# Altium footprint library TSOP65P.PcbLib: 13 footprints
Each footprint in its own frame and in the unit in brackets; x right, y up, seen from the top. Pads: shape width x height; smd on the part's side, far side on the other; paste and mask are expansions set on the pad; w line width, h text height; cw(c..) or ccw(c..) is an arc to the next point about the centre after c.
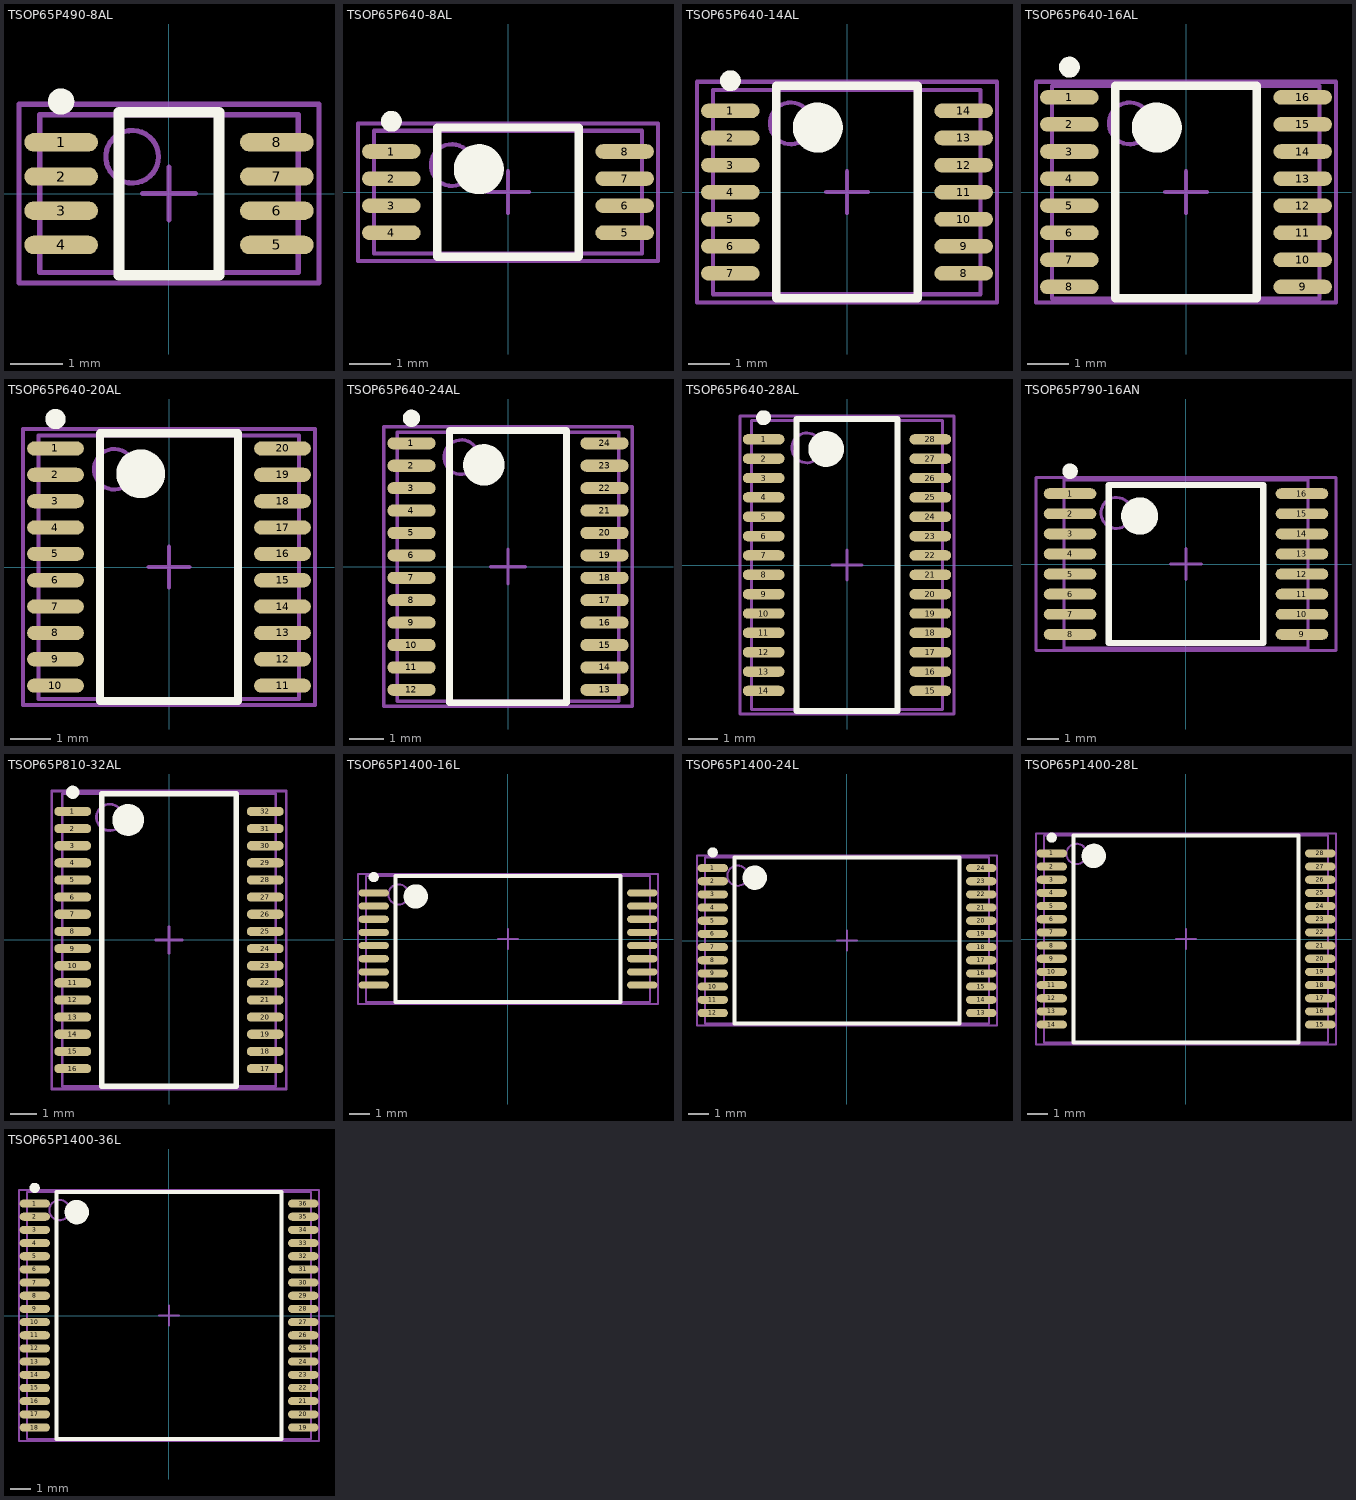
[diagram p0: the footprints below, top view; thin cyan lines are the x and y axes]

## TSOP65P490-8AL [mm] "TSOP, 8-Leads, Body 3x3mm, Pitch 0.65mm, IPC High Density"
height 1.1
pads (8):
  oval 1.4x0.35 smd: 1(-2.05,0.975) 2(-2.05,0.325) 3(-2.05,-0.325) 4(-2.05,-0.975) 5(2.05,-0.975) 6(2.05,-0.325) 7(2.05,0.325) 8(2.05,0.975)
Top Overlay:
  circle w0.25: c-2.05,1.75 r0.125
  lines w0.2: -0.95,-1.55 -0.95,1.55 0.95,1.55 0.95,-1.55 -0.95,-1.55
Mechanical 13:
  circle w0.1: c-0.7,0.7 r0.5
  lines w0.1: -2.458,-1.5 -2.458,1.5 2.458,1.5 2.458,-1.5 -2.458,-1.5
Mechanical 15:
  lines w0.1: -0.5,0 0.5,0 ; 0,-0.5 0,0.5 ; -2.85,-1.7 -2.85,1.7 2.85,1.7 2.85,-1.7 -2.85,-1.7
3D body: height 0.98, standoff 0.02, extent -2.458,-1.5 2.459,1.5

## TSOP65P640-8AL [mm] "TSOP, 8-Leads, Body 3x4.4mm, Pitch 0.65mm, IPC High Density"
height 1.1
pads (8):
  oval 1.4x0.35 smd: 1(-2.8,0.975) 2(-2.8,0.325) 3(-2.8,-0.325) 4(-2.8,-0.975) 5(2.8,-0.975) 6(2.8,-0.325) 7(2.8,0.325) 8(2.8,0.975)
Top Overlay:
  circle w0.25: c-2.8,1.7 r0.125
  circle w0.6: c-0.7,0.55 r0.3
  lines w0.2: -1.7,-1.55 -1.7,1.55 1.7,1.55 1.7,-1.55 -1.7,-1.55
Mechanical 13:
  circle w0.1: c-1.35,0.65 r0.5
  lines w0.1: -3.215,-1.475 -3.215,1.475 3.215,1.475 3.215,-1.475 -3.215,-1.475
Mechanical 15:
  lines w0.1: -0.5,0 0.5,0 ; 0,-0.5 0,0.5 ; -3.6,-1.65 -3.6,1.65 3.6,1.65 3.6,-1.65 -3.6,-1.65
3D body: height 1, standoff 0, extent -3.215,-1.475 3.206,1.475

## TSOP65P640-14AL [mm] "TSOP, 14-Leads, Body 5x4.4mm, Pitch 0.65mm, IPC High Density"
height 1.2
pads (14):
  oval 1.4x0.35 smd: 1(-2.8,1.95) 2(-2.8,1.3) 3(-2.8,0.65) 4(-2.8,0) 5(-2.8,-0.65) 6(-2.8,-1.3) 7(-2.8,-1.95) 8(2.8,-1.95) 9(2.8,-1.3) 10(2.8,-0.65) 11(2.8,0) 12(2.8,0.65) 13(2.8,1.3) 14(2.8,1.95)
Top Overlay:
  circle w0.25: c-2.8,2.675 r0.125
  circle w0.6: c-0.7,1.55 r0.3
  lines w0.2: -1.7,-2.55 -1.7,2.55 1.7,2.55 1.7,-2.55 -1.7,-2.55
Mechanical 13:
  circle w0.1: c-1.35,1.65 r0.5
  lines w0.1: -3.215,-2.45 -3.215,2.45 3.206,2.45 3.206,-2.45 -3.215,-2.45
Mechanical 15:
  lines w0.1: -0.5,0 0.5,0 ; 0,-0.5 0,0.5 ; -3.6,-2.65 -3.6,2.65 3.6,2.65 3.6,-2.65 -3.6,-2.65
3D body: height 1, standoff 0, extent -3.215,-2.45 3.206,2.45

## TSOP65P640-16AL [mm] "TSOP, 16-Leads, Body 5x4.4mm, Pitch 0.65mm, IPC High Density"
height 1.1
pads (16):
  oval 1.4x0.35 smd: 1(-2.8,2.275) 2(-2.8,1.625) 3(-2.8,0.975) 4(-2.8,0.325) 5(-2.8,-0.325) 6(-2.8,-0.975) 7(-2.8,-1.625) 8(-2.8,-2.275) 9(2.8,-2.275) 10(2.8,-1.625) 11(2.8,-0.975) 12(2.8,-0.325) 13(2.8,0.325) 14(2.8,0.975) 15(2.8,1.625) 16(2.8,2.275)
Top Overlay:
  circle w0.6: c-0.7,1.55 r0.3
  circle w0.25: c-2.8,3 r0.125
  lines w0.2: -1.7,-2.55 1.7,-2.55 1.7,2.55 -1.7,2.55 -1.7,-2.55
Mechanical 13:
  circle w0.1: c-1.35,1.65 r0.5
  lines w0.1: -3.215,-2.55 3.206,-2.55 3.206,2.55 -3.215,2.55 -3.215,-2.55
Mechanical 15:
  lines w0.1: -0.5,0 0.5,0 ; 0,-0.5 0,0.5 ; -3.6,-2.65 3.6,-2.65 3.6,2.65 -3.6,2.65 -3.6,-2.65
3D body: height 1, standoff 0, extent -3.215,-2.55 3.206,2.55

## TSOP65P640-20AL [mm] "TSOP, 20-Leads, Body 6.5x4.4mm, Pitch 0.65mm, IPC High Density"
height 1.1
pads (20):
  oval 1.4x0.35 smd: 1(-2.8,2.925) 2(-2.8,2.275) 3(-2.8,1.625) 4(-2.8,0.975) 5(-2.8,0.325) 6(-2.8,-0.325) 7(-2.8,-0.975) 8(-2.8,-1.625) 9(-2.8,-2.275) 10(-2.8,-2.925) 11(2.8,-2.925) 12(2.8,-2.275) 13(2.8,-1.625) 14(2.8,-0.975) 15(2.8,-0.325) 16(2.8,0.325) 17(2.8,0.975) 18(2.8,1.625) 19(2.8,2.275) 20(2.8,2.925)
Top Overlay:
  circle w0.25: c-2.8,3.65 r0.125
  circle w0.6: c-0.7,2.3 r0.3
  lines w0.2: -1.7,-3.3 -1.7,3.3 1.7,3.3 1.7,-3.3 -1.7,-3.3
Mechanical 13:
  circle w0.1: c-1.35,2.412 r0.5
  lines w0.1: -3.215,-3.25 3.206,-3.25 3.206,3.25 -3.215,3.25 -3.215,-3.25
Mechanical 15:
  lines w0.1: -0.5,0 0.5,0 ; 0,-0.5 0,0.5 ; -3.6,-3.4 -3.6,3.4 3.6,3.4 3.6,-3.4 -3.6,-3.4
3D body: height 1, standoff 0, extent -3.215,-3.25 3.206,3.25

## TSOP65P640-24AL [mm] "TSOP, 24-Leads, Body 7.8x4.4mm, Pitch 0.65mm, IPC High Density"
height 1.1
pads (24):
  oval 1.4x0.35 smd: 1(-2.8,3.575) 2(-2.8,2.925) 3(-2.8,2.275) 4(-2.8,1.625) 5(-2.8,0.975) 6(-2.8,0.325) 7(-2.8,-0.325) 8(-2.8,-0.975) 9(-2.8,-1.625) 10(-2.8,-2.275) 11(-2.8,-2.925) 12(-2.8,-3.575) 13(2.8,-3.575) 14(2.8,-2.925) 15(2.8,-2.275) 16(2.8,-1.625) 17(2.8,-0.975) 18(2.8,-0.325) 19(2.8,0.325) 20(2.8,0.975) 21(2.8,1.625) 22(2.8,2.275) 23(2.8,2.925) 24(2.8,3.575)
Top Overlay:
  circle w0.6: c-0.7,2.95 r0.3
  circle w0.25: c-2.8,4.3 r0.125
  lines w0.2: -1.7,-3.95 1.7,-3.95 1.7,3.95 -1.7,3.95 -1.7,-3.95
Mechanical 13:
  circle w0.1: c-1.35,3.174 r0.5
  lines w0.1: -3.215,-3.9 -3.215,3.9 3.206,3.9 3.206,-3.9 -3.215,-3.9
Mechanical 15:
  lines w0.1: -0.5,0 0.5,0 ; 0,-0.5 0,0.5 ; -3.6,-4.05 3.6,-4.05 3.6,4.05 -3.6,4.05 -3.6,-4.05
3D body: height 1, standoff 0, extent -3.215,-3.9 3.206,3.9

## TSOP65P640-28AL [mm] "TSOP, 28-Leads, Body 9.7x4.4mm, Pitch 0.65mm, IPC High Density"
height 1.1
pads (28):
  oval 1.4x0.35 smd: 1(-2.8,4.225) 2(-2.8,3.575) 3(-2.8,2.925) 4(-2.8,2.275) 5(-2.8,1.625) 6(-2.8,0.975) 7(-2.8,0.325) 8(-2.8,-0.325) 9(-2.8,-0.975) 10(-2.8,-1.625) 11(-2.8,-2.275) 12(-2.8,-2.925) 13(-2.8,-3.575) 14(-2.8,-4.225) 15(2.8,-4.225) 16(2.8,-3.575) 17(2.8,-2.925) 18(2.8,-2.275) 19(2.8,-1.625) 20(2.8,-0.975) 21(2.8,-0.325) 22(2.8,0.325) 23(2.8,0.975) 24(2.8,1.625) 25(2.8,2.275) 26(2.8,2.925) 27(2.8,3.575) 28(2.8,4.225)
Top Overlay:
  circle w0.6: c-0.7,3.9 r0.3
  circle w0.25: c-2.8,4.95 r0.125
  lines w0.2: -1.7,-4.9 1.7,-4.9 1.7,4.9 -1.7,4.9 -1.7,-4.9
Mechanical 13:
  circle w0.1: c-1.35,3.936 r0.5
  lines w0.1: -3.215,-4.85 -3.215,4.85 3.206,4.85 3.206,-4.85 -3.215,-4.85
Mechanical 15:
  lines w0.1: -0.5,0 0.5,0 ; 0,-0.5 0,0.5 ; -3.6,-5 3.6,-5 3.6,5 -3.6,5 -3.6,-5
3D body: height 1, standoff 0, extent -3.215,-4.85 3.206,4.85

## TSOP65P790-16AN [mm] "TSOP, 16-Leads, Body 6.33x5.38mm, Pitch 0.65mm, IPC Medium Density"
height 1.1
pads (16):
  oval 1.7x0.35 smd: 1(-3.75,2.275) 2(-3.75,1.625) 3(-3.75,0.975) 4(-3.75,0.325) 5(-3.75,-0.325) 6(-3.75,-0.975) 7(-3.75,-1.625) 8(-3.75,-2.275) 9(3.75,-2.275) 10(3.75,-1.625) 11(3.75,-0.975) 12(3.75,-0.325) 13(3.75,0.325) 14(3.75,0.975) 15(3.75,1.625) 16(3.75,2.275)
Top Overlay:
  circle w0.6: c-1.5,1.55 r0.3
  circle w0.25: c-3.75,3 r0.125
  lines w0.2: -2.5,-2.55 2.5,-2.55 2.5,2.55 -2.5,2.55 -2.5,-2.55
Mechanical 13:
  circle w0.1: c-2.25,1.65 r0.5
  lines w0.1: -3.95,-2.725 3.95,-2.725 3.95,2.725 -3.95,2.725 -3.95,-2.725
Mechanical 15:
  lines w0.1: -0.5,0 0.5,0 ; 0,-0.5 0,0.5 ; -4.85,-2.8 4.85,-2.8 4.85,2.8 -4.85,2.8 -4.85,-2.8
3D body: height 1.15, standoff 0.05, extent -3.95,-2.725 3.95,2.725
3D body: height 0, standoff 0, extent -3.15,-2.55 -3.15,-2.55
3D body: height 0, standoff 0, extent -1.956,-0.864 -1.956,-0.864

## TSOP65P810-32AL [mm] "TSOP, 32-Leads, Body 11x6.2mm, Pitch 0.65mm, IPC High Density"
height 1.2
pads (32):
  oval 1.4x0.35 smd: 1(-3.65,4.875) 2(-3.65,4.225) 3(-3.65,3.575) 4(-3.65,2.925) 5(-3.65,2.275) 6(-3.65,1.625) 7(-3.65,0.975) 8(-3.65,0.325) 9(-3.65,-0.325) 10(-3.65,-0.975) 11(-3.65,-1.625) 12(-3.65,-2.275) 13(-3.65,-2.925) 14(-3.65,-3.575) 15(-3.65,-4.225) 16(-3.65,-4.875) 17(3.65,-4.875) 18(3.65,-4.225) 19(3.65,-3.575) 20(3.65,-2.925) 21(3.65,-2.275) 22(3.65,-1.625) 23(3.65,-0.975) 24(3.65,-0.325) 25(3.65,0.325) 26(3.65,0.975) 27(3.65,1.625) 28(3.65,2.275) 29(3.65,2.925) 30(3.65,3.575) 31(3.65,4.225) 32(3.65,4.875)
Top Overlay:
  circle w0.6: c-1.55,4.55 r0.3
  circle w0.25: c-3.65,5.6 r0.125
  lines w0.2: -2.55,-5.55 2.55,-5.55 2.55,5.55 -2.55,5.55 -2.55,-5.55
Mechanical 13:
  circle w0.1: c-2.25,4.65 r0.5
  lines w0.1: -4.05,-5.55 4.05,-5.55 4.05,5.55 -4.05,5.55 -4.05,-5.55
Mechanical 15:
  lines w0.1: -0.5,0 0.5,0 ; 0,-0.5 0,0.5 ; -4.45,-5.65 4.45,-5.65 4.45,5.65 -4.45,5.65 -4.45,-5.65
3D body: height 1.2, standoff 0, extent -4.05,-5.55 4.05,5.488

## TSOP65P1400-16L [mm] "TSOP, 16-Leads, Body 6.2x12.6mm, Pitch 0.65mm, IPC High Density"
height 1.27
pads (16):
  oval 1.5x0.35 smd: 1(-6.625,2.275) 2(-6.625,1.625) 3(-6.625,0.975) 4(-6.625,0.325) 5(-6.625,-0.325) 6(-6.625,-0.975) 7(-6.625,-1.625) 8(-6.625,-2.275) 9(6.625,-2.275) 10(6.625,-1.625) 11(6.625,-0.975) 12(6.625,-0.325) 13(6.625,0.325) 14(6.625,0.975) 15(6.625,1.625) 16(6.625,2.275)
Top Overlay:
  circle w0.6: c-4.55,2.1 r0.3
  circle w0.25: c-6.625,3.05 r0.125
  lines w0.2: -5.55,-3.1 5.55,-3.1 5.55,3.1 -5.55,3.1 -5.55,-3.1
Mechanical 13:
  circle w0.1: c-5.4,2.2 r0.5
  lines w0.1: -7,-3.1 7,-3.1 7,3.1 -7,3.1 -7,-3.1
Mechanical 15:
  lines w0.1: -0.5,0 0.5,0 ; 0,-0.5 0,0.5 ; -7.4,-3.2 7.4,-3.2 7.4,3.2 -7.4,3.2 -7.4,-3.2
3D body: height 1.2, standoff 0, extent -7,-3.1 7,3.1

## TSOP65P1400-24L [mm] "TSOP, 24-Leads, Body 8.2x12.6mm, Pitch 0.65mm, IPC High Density"
height 1.27
pads (24):
  oval 1.5x0.4 smd: 1(-6.625,3.575) 2(-6.625,2.925) 3(-6.625,2.275) 4(-6.625,1.625) 5(-6.625,0.975) 6(-6.625,0.325) 7(-6.625,-0.325) 8(-6.625,-0.975) 9(-6.625,-1.625) 10(-6.625,-2.275) 11(-6.625,-2.925) 12(-6.625,-3.575) 13(6.625,-3.575) 14(6.625,-2.925) 15(6.625,-2.275) 16(6.625,-1.625) 17(6.625,-0.975) 18(6.625,-0.325) 19(6.625,0.325) 20(6.625,0.975) 21(6.625,1.625) 22(6.625,2.275) 23(6.625,2.925) 24(6.625,3.575)
Top Overlay:
  circle w0.6: c-4.55,3.1 r0.3
  circle w0.25: c-6.625,4.35 r0.125
  lines w0.2: -5.55,-4.1 5.55,-4.1 5.55,4.1 -5.55,4.1 -5.55,-4.1
Mechanical 13:
  circle w0.1: c-5.4,3.2 r0.5
  lines w0.1: -7,-4.1 7,-4.1 7,4.1 -7,4.1 -7,-4.1
Mechanical 15:
  lines w0.1: -0.5,0 0.5,0 ; 0,-0.5 0,0.5 ; -7.4,-4.2 7.4,-4.2 7.4,4.2 -7.4,4.2 -7.4,-4.2
3D body: height 1.2, standoff 0, extent -7,-4.1 7,4.1

## TSOP65P1400-28L [mm] "TSOP, 28-Leads, Body 10.2x12.6mm, Pitch 0.65mm, IPC High Density"
height 1.27
pads (28):
  oval 1.5x0.4 smd: 1(-6.625,4.225) 2(-6.625,3.575) 3(-6.625,2.925) 4(-6.625,2.275) 5(-6.625,1.625) 6(-6.625,0.975) 7(-6.625,0.325) 8(-6.625,-0.325) 9(-6.625,-0.975) 10(-6.625,-1.625) 11(-6.625,-2.275) 12(-6.625,-2.925) 13(-6.625,-3.575) 14(-6.625,-4.225) 15(6.625,-4.225) 16(6.625,-3.575) 17(6.625,-2.925) 18(6.625,-2.275) 19(6.625,-1.625) 20(6.625,-0.975) 21(6.625,-0.325) 22(6.625,0.325) 23(6.625,0.975) 24(6.625,1.625) 25(6.625,2.275) 26(6.625,2.925) 27(6.625,3.575) 28(6.625,4.225)
Top Overlay:
  circle w0.25: c-6.625,5 r0.125
  circle w0.6: c-4.55,4.1 r0.3
  lines w0.2: -5.55,-5.1 -5.55,5.1 5.55,5.1 5.55,-5.1 -5.55,-5.1
Mechanical 13:
  circle w0.1: c-5.4,4.2 r0.5
  lines w0.1: -7,-5.1 -7,5.1 7,5.1 7,-5.1 -7,-5.1
Mechanical 15:
  lines w0.1: -0.5,0 0.5,0 ; 0,-0.5 0,0.5 ; -7.4,-5.2 -7.4,5.2 7.4,5.2 7.4,-5.2 -7.4,-5.2
3D body: height 1.2, standoff 0, extent -7,-5.1 7,5.1

## TSOP65P1400-36L [mm] "TSOP, 36-Leads, Body 12.2x12.6mm, Pitch 0.65mm, IPC High Density"
height 1.27
pads (36):
  oval 1.5x0.4 smd: 1(-6.625,5.525) 2(-6.625,4.875) 3(-6.625,4.225) 4(-6.625,3.575) 5(-6.625,2.925) 6(-6.625,2.275) 7(-6.625,1.625) 8(-6.625,0.975) 9(-6.625,0.325) 10(-6.625,-0.325) 11(-6.625,-0.975) 12(-6.625,-1.625) 13(-6.625,-2.275) 14(-6.625,-2.925) 15(-6.625,-3.575) 16(-6.625,-4.225) 17(-6.625,-4.875) 18(-6.625,-5.525) 19(6.625,-5.525) 20(6.625,-4.875) 21(6.625,-4.225) 22(6.625,-3.575) 23(6.625,-2.925) 24(6.625,-2.275) 25(6.625,-1.625) 26(6.625,-0.975) 27(6.625,-0.325) 28(6.625,0.325) 29(6.625,0.975) 30(6.625,1.625) 31(6.625,2.275) 32(6.625,2.925) 33(6.625,3.575) 34(6.625,4.225) 35(6.625,4.875) 36(6.625,5.525)
Top Overlay:
  circle w0.6: c-4.55,5.1 r0.3
  circle w0.25: c-6.625,6.3 r0.125
  lines w0.2: -5.55,-6.1 5.55,-6.1 5.55,6.1 -5.55,6.1 -5.55,-6.1
Mechanical 13:
  circle w0.1: c-5.4,5.2 r0.5
  lines w0.1: -7,-6.1 7,-6.1 7,6.1 -7,6.1 -7,-6.1
Mechanical 15:
  lines w0.1: -0.5,0 0.5,0 ; 0,-0.5 0,0.5 ; -7.4,-6.2 7.4,-6.2 7.4,6.2 -7.4,6.2 -7.4,-6.2
3D body: height 1.2, standoff 0, extent -7,-6.1 7,6.1